# Altium footprint library domino-rising-cage-clamp.PcbLib: 435 footprints (part 19 of 28)
Each footprint in its own frame and in the unit in brackets; x right, y up, seen from the top. Pads: shape width x height; smd on the part's side, far side on the other; paste and mask are expansions set on the pad; w line width, h text height; cw(c..) or ccw(c..) is an arc to the next point about the centre after c.
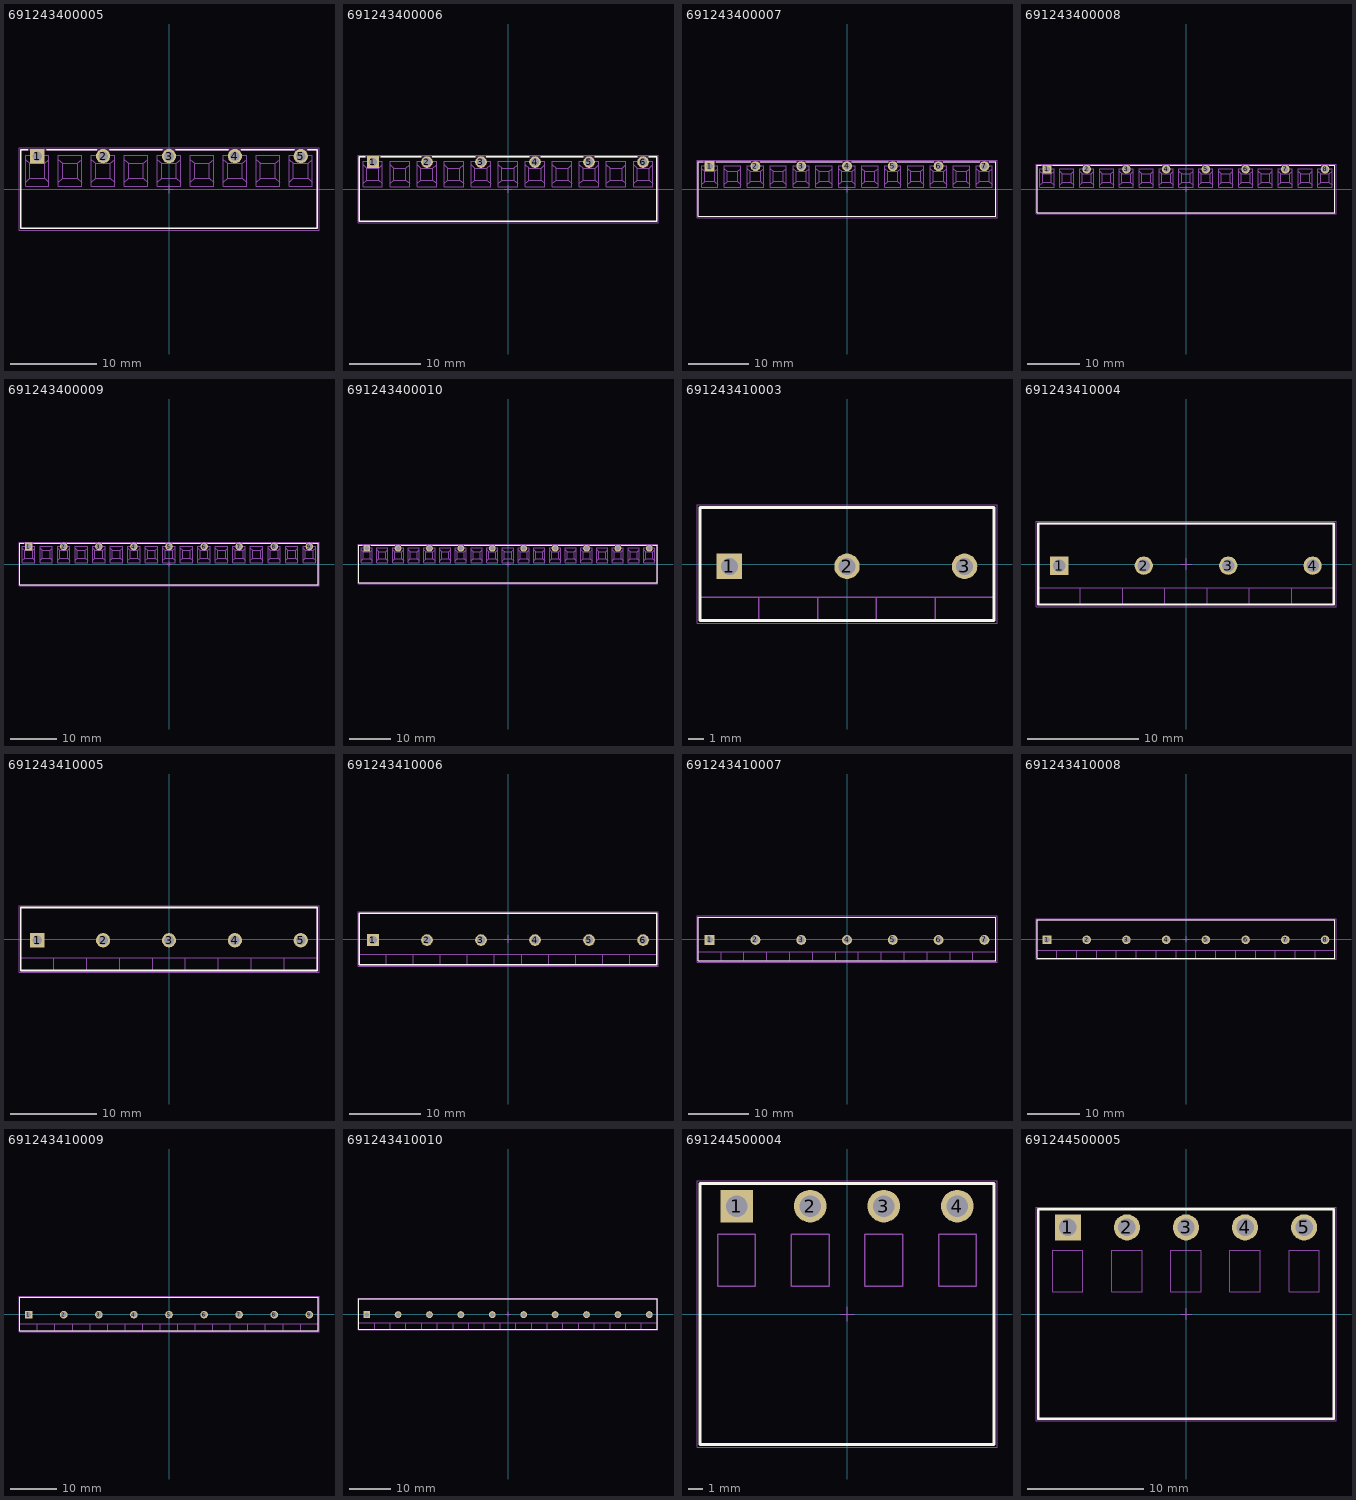
[diagram p18: the footprints below, top view; thin cyan lines are the x and y axes]

## 691243400005 [mm] "Serie 2434 - 7.62 mm _ 5 pins"
height 7.3
pads (5):
  rect 1.65x1.65 hole 1.1: 1(-15.24,3.8)
  round 1.65 hole 1.1: 2(-7.62,3.8) 3(0,3.8) 4(7.62,3.8) 5(15.24,3.8)
Top Overlay:
  lines w0.2: -16.345,4.55 -17.145,4.55 -17.145,-4.55 17.145,-4.55 17.145,4.55 16.035,4.55 ; -14.135,4.55 -8.395,4.55 ; -6.845,4.55 -0.795,4.55 ; 0.775,4.55 6.825,4.55 ; 8.395,4.55 14.445,4.55
Mechanical 13:
  lines w0.05: -16.59,0.79 -16.085,1.245 ; -16.59,3.41 -16.085,2.955 ; -14.395,1.245 -13.89,0.79 ; -14.395,2.955 -13.89,3.41 ; -12.78,0.79 -12.275,1.245 ; -12.78,3.41 -12.275,2.955 ; -10.585,1.245 -10.08,0.79 ; -10.585,2.955 -10.08,3.41 ; -8.97,0.79 -8.465,1.245 ; -8.97,3.41 -8.465,2.955 ; -6.775,1.245 -6.27,0.79 ; -6.775,2.955 -6.27,3.41 ; -5.16,0.79 -4.655,1.245 ; -5.16,3.41 -4.655,2.955 ; -2.965,1.245 -2.46,0.79 ; -2.965,2.955 -2.46,3.41 ; -1.35,0.79 -0.845,1.245 ; -1.35,3.41 -0.845,2.955 ; 0.845,1.245 1.35,0.79 ; 0.845,2.955 1.35,3.41 ; 2.46,0.79 2.965,1.245 ; 2.46,3.41 2.965,2.955 ; 4.655,1.245 5.16,0.79 ; 4.655,2.955 5.16,3.41 ; 6.27,0.79 6.775,1.245 ; 6.27,3.41 6.775,2.955 ; 8.465,1.245 8.97,0.79 ; 8.465,2.955 8.97,3.41 ; 10.08,0.79 10.585,1.245 ; 10.08,3.41 10.585,2.955 ; 12.275,1.245 12.78,0.79 ; 12.275,2.955 12.78,3.41 ; 13.89,0.79 14.395,1.245 ; 13.89,3.41 14.395,2.955 ; 16.085,1.245 16.59,0.79 ; 16.085,2.955 16.59,3.41 ; -16.59,0.29 -13.89,0.29 -13.89,3.91 -16.59,3.91 -16.59,0.29 ; -16.09,1.25 -14.39,1.25 -14.39,2.95 -16.09,2.95 -16.09,1.25 ; -12.78,0.29 -12.78,3.91 -10.08,3.91 -10.08,0.29 -12.78,0.29 ; -12.28,1.25 -12.28,2.95 -10.58,2.95 -10.58,1.25 -12.28,1.25 ; -8.97,0.29 -8.97,3.91 -6.27,3.91 -6.27,0.29 -8.97,0.29 ; -8.47,1.25 -8.47,2.95 -6.77,2.95 -6.77,1.25 -8.47,1.25 ; -5.16,0.29 -5.16,3.91 -2.46,3.91 -2.46,0.29 -5.16,0.29 ; -4.66,1.25 -4.66,2.95 -2.96,2.95 -2.96,1.25 -4.66,1.25 ; -1.35,0.29 -1.35,3.91 1.35,3.91 1.35,0.29 -1.35,0.29 ; -0.85,1.25 -0.85,2.95 0.85,2.95 0.85,1.25 -0.85,1.25 ; 2.46,0.29 5.16,0.29 5.16,3.91 2.46,3.91 2.46,0.29 ; 2.96,1.25 4.66,1.25 4.66,2.95 2.96,2.95 2.96,1.25 ; 6.27,0.29 8.97,0.29 8.97,3.91 6.27,3.91 6.27,0.29 ; 6.77,1.25 8.47,1.25 8.47,2.95 6.77,2.95 6.77,1.25 ; 10.08,0.29 10.08,3.91 12.78,3.91 12.78,0.29 10.08,0.29 ; 10.58,1.25 10.58,2.95 12.28,2.95 12.28,1.25 10.58,1.25 ; 13.89,0.29 13.89,3.91 16.59,3.91 16.59,0.29 13.89,0.29 ; 14.39,1.25 14.39,2.95 16.09,2.95 16.09,1.25 14.39,1.25
  lines w0.1: -17.145,-4.55 -17.145,4.55 17.145,4.55 17.145,-4.55 -17.145,-4.55
Mechanical 15:
  lines w0.05: -0.5,0 0.5,0 ; 0,-0.5 0,0.5 ; -17.345,-4.75 17.345,-4.75 17.345,4.75 -17.345,4.75 -17.345,-4.75
3D body "691243400005.stp": height 7.35, standoff -3.45, extent -17.145,-4.55 17.145,4.55

## 691243400006 [mm] "Serie 2434 - 7.62 mm _ 6 pins"
height 7.3
pads (6):
  rect 1.65x1.65 hole 1.1: 1(-19.05,3.8)
  round 1.65 hole 1.1: 2(-11.43,3.8) 3(-3.81,3.8) 4(3.81,3.8) 5(11.43,3.8) 6(19.05,3.8)
Top Overlay:
  lines w0.2: -20.155,4.55 -20.955,4.55 -20.955,-4.55 20.955,-4.55 20.955,4.55 19.845,4.55 ; -17.945,4.55 -12.205,4.55 ; -10.655,4.55 -4.605,4.55 ; -3.035,4.55 3.015,4.55 ; 4.585,4.55 10.635,4.55 ; 12.205,4.55 18.255,4.55
Mechanical 13:
  lines w0.05: -20.4,0.79 -19.895,1.245 ; -20.4,3.41 -19.895,2.955 ; -18.205,1.245 -17.7,0.79 ; -18.205,2.955 -17.7,3.41 ; -16.59,0.79 -16.085,1.245 ; -16.59,3.41 -16.085,2.955 ; -14.395,1.245 -13.89,0.79 ; -14.395,2.955 -13.89,3.41 ; -12.78,0.79 -12.275,1.245 ; -12.78,3.41 -12.275,2.955 ; -10.585,1.245 -10.08,0.79 ; -10.585,2.955 -10.08,3.41 ; -8.97,0.79 -8.465,1.245 ; -8.97,3.41 -8.465,2.955 ; -6.775,1.245 -6.27,0.79 ; -6.775,2.955 -6.27,3.41 ; -5.16,0.79 -4.655,1.245 ; -5.16,3.41 -4.655,2.955 ; -2.965,1.245 -2.46,0.79 ; -2.965,2.955 -2.46,3.41 ; -1.35,0.79 -0.845,1.245 ; -1.35,3.41 -0.845,2.955 ; 0.845,1.245 1.35,0.79 ; 0.845,2.955 1.35,3.41 ; 2.46,0.79 2.965,1.245 ; 2.46,3.41 2.965,2.955 ; 4.655,1.245 5.16,0.79 ; 4.655,2.955 5.16,3.41 ; 6.27,0.79 6.775,1.245 ; 6.27,3.41 6.775,2.955 ; 8.465,1.245 8.97,0.79 ; 8.465,2.955 8.97,3.41 ; 10.08,0.79 10.585,1.245 ; 10.08,3.41 10.585,2.955 ; 12.275,1.245 12.78,0.79 ; 12.275,2.955 12.78,3.41 ; 13.89,0.79 14.395,1.245 ; 13.89,3.41 14.395,2.955 ; 16.085,1.245 16.59,0.79 ; 16.085,2.955 16.59,3.41 ; 17.7,0.79 18.205,1.245 ; 17.7,3.41 18.205,2.955 ; 19.895,1.245 20.4,0.79 ; 19.895,2.955 20.4,3.41 ; -20.4,0.29 -20.4,3.91 -17.7,3.91 -17.7,0.29 -20.4,0.29 ; -19.9,1.25 -19.9,2.95 -18.2,2.95 -18.2,1.25 -19.9,1.25 ; -16.59,0.29 -13.89,0.29 -13.89,3.91 -16.59,3.91 -16.59,0.29 ; -16.09,1.25 -14.39,1.25 -14.39,2.95 -16.09,2.95 -16.09,1.25 ; -12.78,0.29 -10.08,0.29 -10.08,3.91 -12.78,3.91 -12.78,0.29 ; -12.28,1.25 -10.58,1.25 -10.58,2.95 -12.28,2.95 -12.28,1.25 ; -8.97,0.29 -6.27,0.29 -6.27,3.91 -8.97,3.91 -8.97,0.29 ; -8.47,1.25 -6.77,1.25 -6.77,2.95 -8.47,2.95 -8.47,1.25 ; -5.16,0.29 -2.46,0.29 -2.46,3.91 -5.16,3.91 -5.16,0.29 ; -4.66,1.25 -2.96,1.25 -2.96,2.95 -4.66,2.95 -4.66,1.25 ; -1.35,0.29 -1.35,3.91 1.35,3.91 1.35,0.29 -1.35,0.29 ; -0.85,1.25 -0.85,2.95 0.85,2.95 0.85,1.25 -0.85,1.25 ; 2.46,0.29 2.46,3.91 5.16,3.91 5.16,0.29 2.46,0.29 ; 2.96,1.25 2.96,2.95 4.66,2.95 4.66,1.25 2.96,1.25 ; 6.27,0.29 8.97,0.29 8.97,3.91 6.27,3.91 6.27,0.29 ; 6.77,1.25 8.47,1.25 8.47,2.95 6.77,2.95 6.77,1.25 ; 10.08,0.29 12.78,0.29 12.78,3.91 10.08,3.91 10.08,0.29 ; 10.58,1.25 12.28,1.25 12.28,2.95 10.58,2.95 10.58,1.25 ; 13.89,0.29 13.89,3.91 16.59,3.91 16.59,0.29 13.89,0.29 ; 14.39,1.25 14.39,2.95 16.09,2.95 16.09,1.25 14.39,1.25 ; 17.7,0.29 17.7,3.91 20.4,3.91 20.4,0.29 17.7,0.29 ; 18.2,1.25 18.2,2.95 19.9,2.95 19.9,1.25 18.2,1.25
  lines w0.1: -20.955,-4.55 20.955,-4.55 20.955,4.55 -20.955,4.55 -20.955,-4.55
Mechanical 15:
  lines w0.05: -0.5,0 0.5,0 ; 0,-0.5 0,0.5 ; -21.155,-4.75 -21.155,4.75 21.155,4.75 21.155,-4.75 -21.155,-4.75
3D body "691243400006.stp": height 7.35, standoff -3.45, extent -20.955,-4.55 20.955,4.55

## 691243400007 [mm] "Serie 2434 - 7.62 mm _ 7 pins"
height 7.3
pads (7):
  rect 1.65x1.65 hole 1.1: 1(-22.86,3.8)
  round 1.65 hole 1.1: 2(-15.24,3.8) 3(-7.62,3.8) 4(0,3.8) 5(7.62,3.8) 6(15.24,3.8) 7(22.86,3.8)
Top Overlay:
  lines w0.2: -23.965,4.55 -24.765,4.55 -24.765,-4.55 24.765,-4.55 24.765,4.55 23.655,4.55 ; -21.755,4.55 -16.015,4.55 ; -14.465,4.55 -8.415,4.55 ; -6.845,4.55 -0.795,4.55 ; 0.775,4.55 6.825,4.55 ; 8.395,4.55 14.445,4.55 ; 16.015,4.55 22.065,4.55
Mechanical 13:
  drawing of 160 lines, arcs and shapes, not listed
Mechanical 15:
  lines w0.05: -0.5,0 0.5,0 ; 0,-0.5 0,0.5 ; -24.965,-4.75 -24.965,4.75 24.965,4.75 24.965,-4.75 -24.965,-4.75
3D body "691243400007.stp": height 7.35, standoff -3.45, extent -24.765,-4.55 24.765,4.55

## 691243400008 [mm] "Serie 2434 - 7.62 mm _ 8 pins"
height 7.3
pads (8):
  rect 1.65x1.65 hole 1.1: 1(-26.67,3.8)
  round 1.65 hole 1.1: 2(-19.05,3.8) 3(-11.43,3.8) 4(-3.81,3.8) 5(3.81,3.8) 6(11.43,3.8) 7(19.05,3.8) 8(26.67,3.8)
Top Overlay:
  lines w0.2: -27.775,4.55 -28.575,4.55 -28.575,-4.55 28.575,-4.55 28.575,4.55 27.465,4.55 ; -25.565,4.55 -19.825,4.55 ; -18.275,4.55 -12.225,4.55 ; -10.655,4.55 -4.605,4.55 ; -3.035,4.55 3.015,4.55 ; 4.585,4.55 10.635,4.55 ; 12.205,4.55 18.255,4.55 ; 19.825,4.55 25.875,4.55
Mechanical 13:
  drawing of 184 lines, arcs and shapes, not listed
Mechanical 15:
  lines w0.05: -0.5,0 0.5,0 ; 0,-0.5 0,0.5 ; -28.775,-4.75 28.775,-4.75 28.775,4.75 -28.775,4.75 -28.775,-4.75
3D body "691243400008.stp": height 7.35, standoff -3.45, extent -28.575,-4.55 28.575,4.55

## 691243400009 [mm] "Serie 2434 - 7.62 mm _ 9 pins"
height 7.3
pads (9):
  rect 1.65x1.65 hole 1.1: 1(-30.48,3.8)
  round 1.65 hole 1.1: 2(-22.86,3.8) 3(-15.24,3.8) 4(-7.62,3.8) 5(0,3.8) 6(7.62,3.8) 7(15.24,3.8) 8(22.86,3.8) 9(30.48,3.8)
Top Overlay:
  lines w0.2: -31.585,4.55 -32.385,4.55 -32.385,-4.55 32.385,-4.55 32.385,4.55 31.275,4.55 ; -29.375,4.55 -23.635,4.55 ; -22.085,4.55 -16.035,4.55 ; -14.465,4.55 -8.415,4.55 ; -6.845,4.55 -0.795,4.55 ; 0.775,4.55 6.825,4.55 ; 8.395,4.55 14.445,4.55 ; 16.015,4.55 22.065,4.55 ; 23.635,4.55 29.685,4.55
Mechanical 13:
  drawing of 208 lines, arcs and shapes, not listed
Mechanical 15:
  lines w0.05: -0.5,0 0.5,0 ; 0,-0.5 0,0.5 ; -32.585,-4.75 -32.585,4.75 32.585,4.75 32.585,-4.75 -32.585,-4.75
3D body "691243400009.stp": height 7.35, standoff -3.45, extent -32.385,-4.55 32.385,4.55

## 691243400010 [mm] "Serie 2434 - 7.62 mm _ 10 pins"
height 7.3
pads (10):
  rect 1.65x1.65 hole 1.1: 1(-34.29,3.8)
  round 1.65 hole 1.1: 2(-26.67,3.8) 3(-19.05,3.8) 4(-11.43,3.8) 5(-3.81,3.8) 6(3.81,3.8) 7(11.43,3.8) 8(19.05,3.8) 9(26.67,3.8) 10(34.29,3.8)
Top Overlay:
  lines w0.2: -35.395,4.55 -36.195,4.55 -36.195,-4.55 36.195,-4.55 36.195,4.55 35.085,4.55 ; -33.185,4.55 -27.445,4.55 ; -25.895,4.55 -19.845,4.55 ; -18.275,4.55 -12.225,4.55 ; -10.655,4.55 -4.605,4.55 ; -3.035,4.55 3.015,4.55 ; 4.585,4.55 10.635,4.55 ; 12.205,4.55 18.255,4.55 ; 19.825,4.55 25.875,4.55 ; 27.445,4.55 33.495,4.55
Mechanical 13:
  drawing of 232 lines, arcs and shapes, not listed
Mechanical 15:
  lines w0.05: -0.5,0 0.5,0 ; 0,-0.5 0,0.5 ; -36.395,-4.75 36.395,-4.75 36.395,4.75 -36.395,4.75 -36.395,-4.75
3D body "691243400010.stp": height 7.35, standoff -3.45, extent -36.195,-4.55 36.195,4.55

## 691243410003 [mm] "Serie 2434 - 7.62 mm _ 3 pins"
height 9.1
pads (3):
  rect 1.65x1.65 hole 1.1: 1(-7.62,-0.15)
  round 1.65 hole 1.1: 2(0,-0.15) 3(7.62,-0.15)
Top Overlay:
  lines w0.2: -9.525,-3.65 9.525,-3.65 9.525,3.65 -9.525,3.65 -9.525,-3.65
Mechanical 13:
  lines w0.1: -9.525,-2.15 9.525,-2.15 ; -5.715,-3.65 -5.715,-2.15 ; -1.905,-3.65 -1.905,-2.15 ; 1.905,-3.65 1.905,-2.15 ; 5.715,-3.65 5.715,-2.15 ; -9.525,-3.65 -9.525,3.65 9.525,3.65 9.525,-3.65 -9.525,-3.65
Mechanical 15:
  lines w0.05: -0.5,0 0.5,0 ; 0,-0.5 0,0.5 ; -9.725,-3.85 9.725,-3.85 9.725,3.85 -9.725,3.85 -9.725,-3.85
3D body "691243410003.stp": height 9.15, standoff -3.45, extent -9.525,-3.65 9.525,3.65

## 691243410004 [mm] "Serie 2434 - 7.62 mm _ 4 pins"
height 9.1
pads (4):
  rect 1.65x1.65 hole 1.1: 1(-11.43,-0.15)
  round 1.65 hole 1.1: 2(-3.81,-0.15) 3(3.81,-0.15) 4(11.43,-0.15)
Top Overlay:
  lines w0.2: -13.335,-3.65 -13.335,3.65 13.335,3.65 13.335,-3.65 -13.335,-3.65
Mechanical 13:
  lines w0.1: -13.335,-2.15 13.335,-2.15 ; -9.525,-3.65 -9.525,-2.15 ; -5.715,-3.65 -5.715,-2.15 ; -1.905,-3.65 -1.905,-2.15 ; 1.905,-3.65 1.905,-2.15 ; 5.715,-3.65 5.715,-2.15 ; 9.525,-3.65 9.525,-2.15 ; -13.335,-3.65 13.335,-3.65 13.335,3.65 -13.335,3.65 -13.335,-3.65
Mechanical 15:
  lines w0.05: -0.5,0 0.5,0 ; 0,-0.5 0,0.5 ; -13.535,-3.85 -13.535,3.85 13.535,3.85 13.535,-3.85 -13.535,-3.85
3D body "691243410004.stp": height 9.15, standoff -3.45, extent -13.335,-3.65 13.335,3.65

## 691243410005 [mm] "Serie 2434 - 7.62 mm _ 5 pins"
height 9.1
pads (5):
  rect 1.65x1.65 hole 1.1: 1(-15.24,-0.15)
  round 1.65 hole 1.1: 2(-7.62,-0.15) 3(0,-0.15) 4(7.62,-0.15) 5(15.24,-0.15)
Top Overlay:
  lines w0.2: -17.145,-3.65 -17.145,3.65 17.145,3.65 17.145,-3.65 -17.145,-3.65
Mechanical 13:
  lines w0.1: -17.145,-2.15 17.145,-2.15 ; -13.335,-3.65 -13.335,-2.15 ; -9.525,-3.65 -9.525,-2.15 ; -5.715,-3.65 -5.715,-2.15 ; -1.905,-3.65 -1.905,-2.15 ; 1.905,-3.65 1.905,-2.15 ; 5.715,-3.65 5.715,-2.15 ; 9.525,-3.65 9.525,-2.15 ; 13.335,-3.65 13.335,-2.15 ; -17.145,-3.65 17.145,-3.65 17.145,3.65 -17.145,3.65 -17.145,-3.65
Mechanical 15:
  lines w0.05: -0.5,0 0.5,0 ; 0,-0.5 0,0.5 ; -17.345,-3.85 -17.345,3.85 17.345,3.85 17.345,-3.85 -17.345,-3.85
3D body "691243410005.stp": height 9.15, standoff -3.45, extent -17.145,-3.65 17.145,3.65

## 691243410006 [mm] "Serie 2434 - 7.62 mm _ 6 pins"
height 9.1
pads (6):
  rect 1.65x1.65 hole 1.1: 1(-19.05,-0.15)
  round 1.65 hole 1.1: 2(-11.43,-0.15) 3(-3.81,-0.15) 4(3.81,-0.15) 5(11.43,-0.15) 6(19.05,-0.15)
Top Overlay:
  lines w0.2: -20.955,-3.65 20.955,-3.65 20.955,3.65 -20.955,3.65 -20.955,-3.65
Mechanical 13:
  lines w0.1: -20.955,-2.15 20.955,-2.15 ; -17.145,-3.65 -17.145,-2.15 ; -13.335,-3.65 -13.335,-2.15 ; -9.525,-3.65 -9.525,-2.15 ; -5.715,-3.65 -5.715,-2.15 ; -1.905,-3.65 -1.905,-2.15 ; 1.905,-3.65 1.905,-2.15 ; 5.715,-3.65 5.715,-2.15 ; 9.525,-3.65 9.525,-2.15 ; 13.335,-3.65 13.335,-2.15 ; 17.145,-3.65 17.145,-2.15 ; -20.955,-3.65 -20.955,3.65 20.955,3.65 20.955,-3.65 -20.955,-3.65
Mechanical 15:
  lines w0.05: -0.5,0 0.5,0 ; 0,-0.5 0,0.5 ; -21.155,-3.85 21.155,-3.85 21.155,3.85 -21.155,3.85 -21.155,-3.85
3D body "691243410006.stp": height 9.15, standoff -3.45, extent -20.955,-3.65 20.955,3.65

## 691243410007 [mm] "Serie 2434 - 7.62 mm _ 7 pins"
height 9.1
pads (7):
  rect 1.65x1.65 hole 1.1: 1(-22.86,-0.15)
  round 1.65 hole 1.1: 2(-15.24,-0.15) 3(-7.62,-0.15) 4(0,-0.15) 5(7.62,-0.15) 6(15.24,-0.15) 7(22.86,-0.15)
Top Overlay:
  lines w0.2: -24.765,-3.65 24.765,-3.65 24.765,3.65 -24.765,3.65 -24.765,-3.65
Mechanical 13:
  lines w0.1: -24.765,-2.15 24.765,-2.15 ; -20.955,-3.65 -20.955,-2.15 ; -17.145,-3.65 -17.145,-2.15 ; -13.335,-3.65 -13.335,-2.15 ; -9.525,-3.65 -9.525,-2.15 ; -5.715,-3.65 -5.715,-2.15 ; -1.905,-3.65 -1.905,-2.15 ; 1.905,-3.65 1.905,-2.15 ; 5.715,-3.65 5.715,-2.15 ; 9.525,-3.65 9.525,-2.15 ; 13.335,-3.65 13.335,-2.15 ; 17.145,-3.65 17.145,-2.15 ; 20.955,-3.65 20.955,-2.15 ; -24.765,-3.65 -24.765,3.65 24.765,3.65 24.765,-3.65 -24.765,-3.65
Mechanical 15:
  lines w0.05: -0.5,0 0.5,0 ; 0,-0.5 0,0.5 ; -24.965,-3.85 24.965,-3.85 24.965,3.85 -24.965,3.85 -24.965,-3.85
3D body "691243410007.stp": height 9.15, standoff -3.45, extent -24.765,-3.65 24.765,3.65

## 691243410008 [mm] "Serie 2434 - 7.62 mm _ 8 pins"
height 9.1
pads (8):
  rect 1.65x1.65 hole 1.1: 1(-26.67,-0.15)
  round 1.65 hole 1.1: 2(-19.05,-0.15) 3(-11.43,-0.15) 4(-3.81,-0.15) 5(3.81,-0.15) 6(11.43,-0.15) 7(19.05,-0.15) 8(26.67,-0.15)
Top Overlay:
  lines w0.2: -28.575,-3.65 -28.575,3.65 28.575,3.65 28.575,-3.65 -28.575,-3.65
Mechanical 13:
  lines w0.1: -28.575,-2.15 28.575,-2.15 ; -24.765,-3.65 -24.765,-2.15 ; -20.955,-3.65 -20.955,-2.15 ; -17.145,-3.65 -17.145,-2.15 ; -13.335,-3.65 -13.335,-2.15 ; -9.525,-3.65 -9.525,-2.15 ; -5.715,-3.65 -5.715,-2.15 ; -1.905,-3.65 -1.905,-2.15 ; 1.905,-3.65 1.905,-2.15 ; 5.715,-3.65 5.715,-2.15 ; 9.525,-3.65 9.525,-2.15 ; 13.335,-3.65 13.335,-2.15 ; 17.145,-3.65 17.145,-2.15 ; 20.955,-3.65 20.955,-2.15 ; 24.765,-3.65 24.765,-2.15 ; -28.575,-3.65 28.575,-3.65 28.575,3.65 -28.575,3.65 -28.575,-3.65
Mechanical 15:
  lines w0.05: -0.5,0 0.5,0 ; 0,-0.5 0,0.5 ; -28.775,-3.85 -28.775,3.85 28.775,3.85 28.775,-3.85 -28.775,-3.85
3D body "691243410008.stp": height 9.15, standoff -3.45, extent -28.575,-3.65 28.575,3.65

## 691243410009 [mm] "Serie 2434 - 7.62 mm _ 9 pins"
height 9.1
pads (9):
  rect 1.65x1.65 hole 1.1: 1(-30.48,-0.15)
  round 1.65 hole 1.1: 2(-22.86,-0.15) 3(-15.24,-0.15) 4(-7.62,-0.15) 5(0,-0.15) 6(7.62,-0.15) 7(15.24,-0.15) 8(22.86,-0.15) 9(30.48,-0.15)
Top Overlay:
  lines w0.2: -32.385,-3.65 -32.385,3.65 32.385,3.65 32.385,-3.65 -32.385,-3.65
Mechanical 13:
  lines w0.1: -32.385,-2.15 32.385,-2.15 ; -28.575,-3.65 -28.575,-2.15 ; -24.765,-3.65 -24.765,-2.15 ; -20.955,-3.65 -20.955,-2.15 ; -17.145,-3.65 -17.145,-2.15 ; -13.335,-3.65 -13.335,-2.15 ; -9.525,-3.65 -9.525,-2.15 ; -5.715,-3.65 -5.715,-2.15 ; -1.905,-3.65 -1.905,-2.15 ; 1.905,-3.65 1.905,-2.15 ; 5.715,-3.65 5.715,-2.15 ; 9.525,-3.65 9.525,-2.15 ; 13.335,-3.65 13.335,-2.15 ; 17.145,-3.65 17.145,-2.15 ; 20.955,-3.65 20.955,-2.15 ; 24.765,-3.65 24.765,-2.15 ; 28.575,-3.65 28.575,-2.15 ; -32.385,-3.65 32.385,-3.65 32.385,3.65 -32.385,3.65 -32.385,-3.65
Mechanical 15:
  lines w0.05: -0.5,0 0.5,0 ; 0,-0.5 0,0.5 ; -32.585,-3.85 -32.585,3.85 32.585,3.85 32.585,-3.85 -32.585,-3.85
3D body "691243410009.stp": height 9.15, standoff -3.45, extent -32.385,-3.65 32.385,3.65

## 691243410010 [mm] "Serie 2434 - 7.62 mm _ 10 pins"
height 9.1
pads (10):
  rect 1.65x1.65 hole 1.1: 1(-34.29,-0.15)
  round 1.65 hole 1.1: 2(-26.67,-0.15) 3(-19.05,-0.15) 4(-11.43,-0.15) 5(-3.81,-0.15) 6(3.81,-0.15) 7(11.43,-0.15) 8(19.05,-0.15) 9(26.67,-0.15) 10(34.29,-0.15)
Top Overlay:
  lines w0.2: -36.195,-3.65 36.195,-3.65 36.195,3.65 -36.195,3.65 -36.195,-3.65
Mechanical 13:
  lines w0.1: -36.195,-2.15 36.195,-2.15 ; -32.385,-3.65 -32.385,-2.15 ; -28.575,-3.65 -28.575,-2.15 ; -24.765,-3.65 -24.765,-2.15 ; -20.955,-3.65 -20.955,-2.15 ; -17.145,-3.65 -17.145,-2.15 ; -13.335,-3.65 -13.335,-2.15 ; -9.525,-3.65 -9.525,-2.15 ; -5.715,-3.65 -5.715,-2.15 ; -1.905,-3.65 -1.905,-2.15 ; 1.905,-3.65 1.905,-2.15 ; 5.715,-3.65 5.715,-2.15 ; 9.525,-3.65 9.525,-2.15 ; 13.335,-3.65 13.335,-2.15 ; 17.145,-3.65 17.145,-2.15 ; 20.955,-3.65 20.955,-2.15 ; 24.765,-3.65 24.765,-2.15 ; 28.575,-3.65 28.575,-2.15 ; 32.385,-3.65 32.385,-2.15 ; -36.195,-3.65 -36.195,3.65 36.195,3.65 36.195,-3.65 -36.195,-3.65
Mechanical 15:
  lines w0.05: -0.5,0 0.5,0 ; 0,-0.5 0,0.5 ; -36.395,-3.85 36.395,-3.85 36.395,3.85 -36.395,3.85 -36.395,-3.85
3D body "691243410010.stp": height 9.15, standoff -3.45, extent -36.195,-3.65 36.195,3.65

## 691244500004 [mm] "Serie 2445 - 5.08 mm _ 4 pins"
height 11.2
pads (4):
  rect 2.25x2.25 hole 1.5: 1(-7.62,7.45)
  round 2.25 hole 1.5: 2(-2.54,7.45) 3(2.54,7.45) 4(7.62,7.45)
Top Overlay:
  lines w0.2: -10.16,-9 -10.16,9 10.16,9 10.16,-9 -10.16,-9
Mechanical 13:
  lines w0.1: -10.16,-9 10.16,-9 10.16,9 -10.16,9 -10.16,-9 ; -8.92,1.9 -6.32,1.9 -6.32,5.5 -8.92,5.5 -8.92,1.9 ; -3.84,1.9 -3.84,5.5 -1.24,5.5 -1.24,1.9 -3.84,1.9 ; 1.24,1.9 1.24,5.5 3.84,5.5 3.84,1.9 1.24,1.9 ; 6.32,1.9 6.32,5.5 8.92,5.5 8.92,1.9 6.32,1.9
Mechanical 15:
  lines w0.05: -0.5,0 0.5,0 ; 0,-0.5 0,0.5 ; -10.36,-9.2 -10.36,9.2 10.36,9.2 10.36,-9.2 -10.36,-9.2
3D body "691244500004.stp": height 11.25, standoff -3.95, extent -10.16,-9 10.16,9

## 691244500005 [mm] "Serie 2445 - 5.08 mm _ 5 pins"
height 11.2
pads (5):
  rect 2.25x2.25 hole 1.5: 1(-10.16,7.45)
  round 2.25 hole 1.5: 2(-5.08,7.45) 3(0,7.45) 4(5.08,7.45) 5(10.16,7.45)
Top Overlay:
  lines w0.2: -12.7,-9 -12.7,9 12.7,9 12.7,-9 -12.7,-9
Mechanical 13:
  lines w0.1: -12.7,-9 12.7,-9 12.7,9 -12.7,9 -12.7,-9 ; -11.46,1.9 -8.86,1.9 -8.86,5.5 -11.46,5.5 -11.46,1.9 ; -6.38,1.9 -6.38,5.5 -3.78,5.5 -3.78,1.9 -6.38,1.9 ; -1.3,1.9 -1.3,5.5 1.3,5.5 1.3,1.9 -1.3,1.9 ; 3.78,1.9 3.78,5.5 6.38,5.5 6.38,1.9 3.78,1.9 ; 8.86,1.9 11.46,1.9 11.46,5.5 8.86,5.5 8.86,1.9
Mechanical 15:
  lines w0.05: -0.5,0 0.5,0 ; 0,-0.5 0,0.5 ; -12.9,-9.2 -12.9,9.2 12.9,9.2 12.9,-9.2 -12.9,-9.2
3D body "691244500005.stp": height 11.25, standoff -3.95, extent -12.7,-9 12.7,9